# Altium footprint library GRID.PcbLib: 54 footprints (part 3 of 4)
Each footprint in its own frame and in the unit in brackets; x right, y up, seen from the top. Pads: shape width x height; smd on the part's side, far side on the other; paste and mask are expansions set on the pad; w line width, h text height; cw(c..) or ccw(c..) is an arc to the next point about the centre after c.
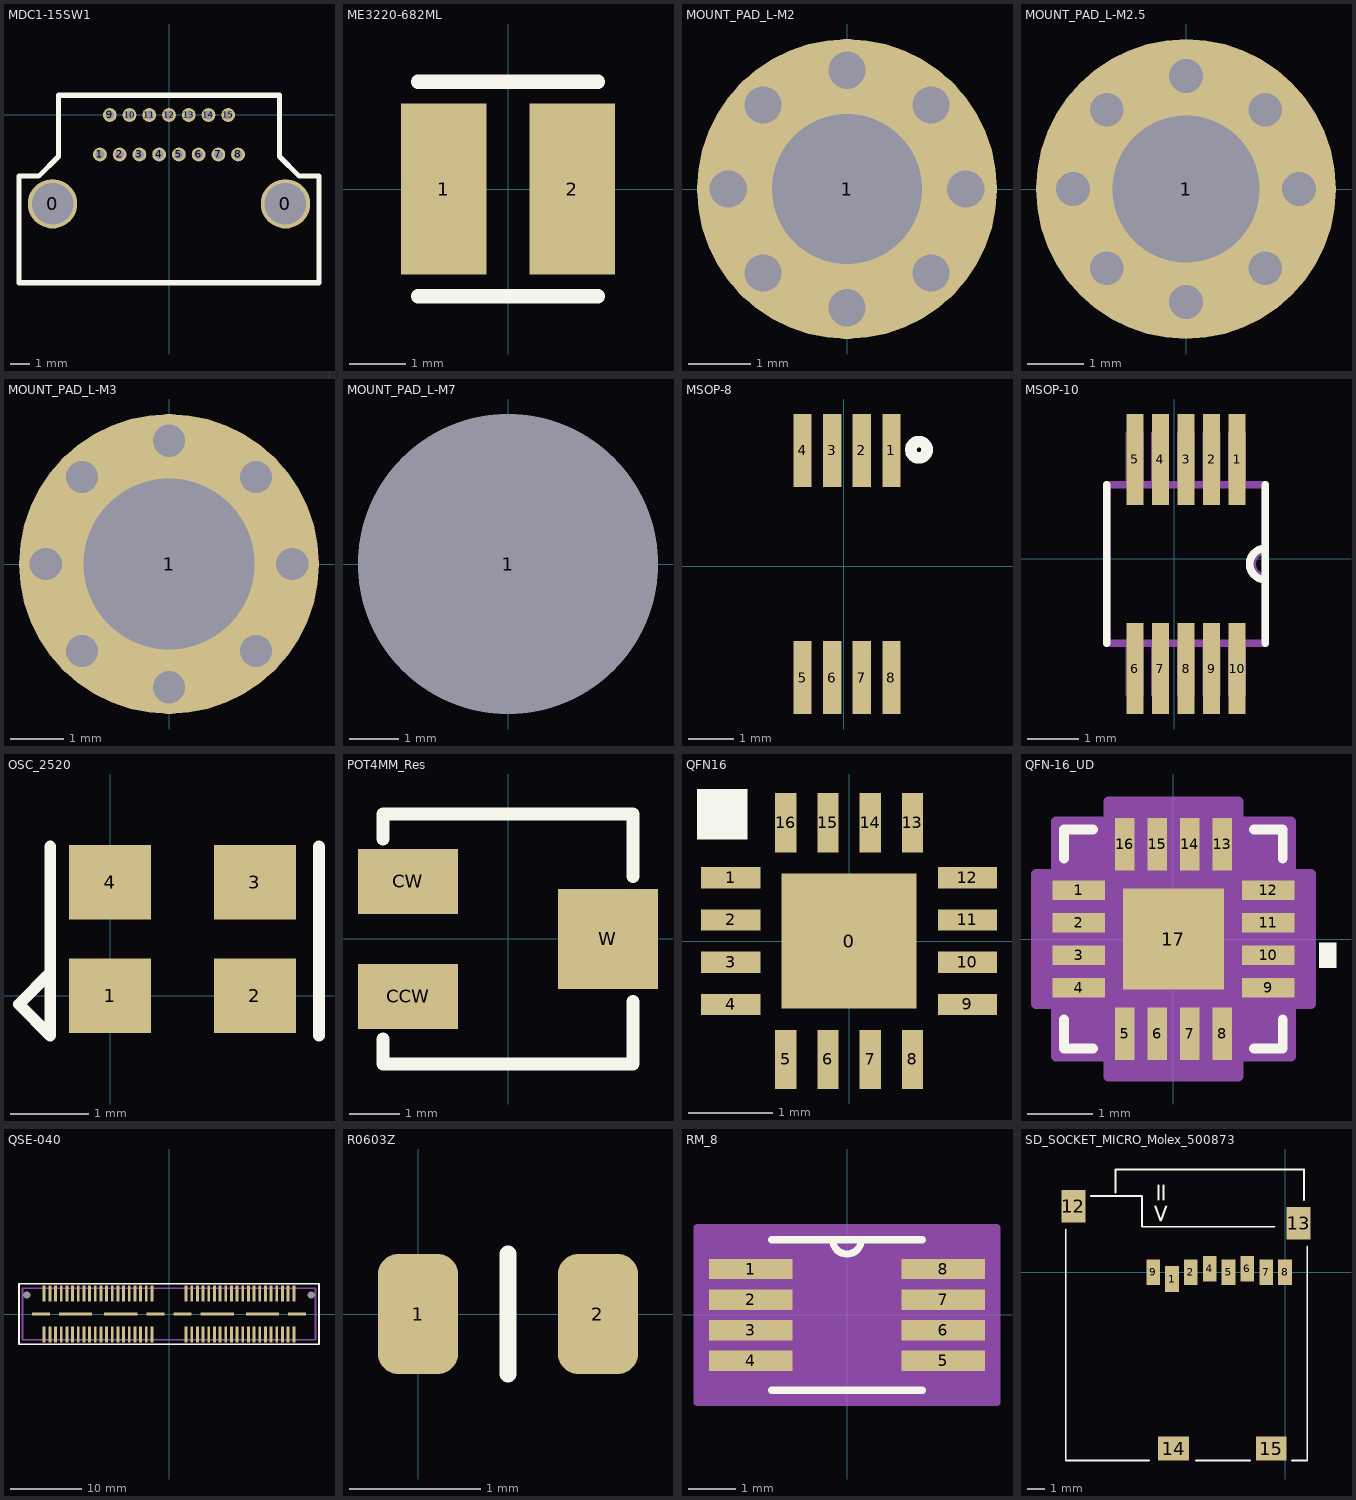
[diagram p2: the footprints below, top view; thin cyan lines are the x and y axes]

## MDC1-15SW1 [mm]
pads (17):
  round 2.5 hole 2.1: 0(-5.9,-4.5) 0(5.9,-4.5)
  round 0.7 hole 0.45: 1(-3.5,-2) 2(-2.5,-2) 3(-1.5,-2) 4(-0.5,-2) 5(0.5,-2) 6(1.5,-2) 7(2.501,-2) 8(3.5,-2) 9(-3,0) 10(-2,0) 11(-1,0) 12(0,0) 13(1,0) 14(2,0) 15(3,0)
Top Overlay:
  lines w0.254: -7.6,-8.5 -7.6,-4.5 -7.6,-3.1 -6.6,-3.1 -5.6,-2.1 -5.6,1 5.6,1 5.6,-2.1 6.6,-3.1 7.6,-3.1 7.6,-4.5 7.6,-8.5 -7.6,-8.5
3D body "MDC1-15SW1.STEP": height 3.8, standoff -2.6, extent -7.58,-8.497 7.62,1.003

## ME3220-682ML [mil] "ME3220-682ML"
pads (2):
  rect 60x120 smd: 1(-45,0) 2(45,0)
Top Overlay:
  lines w10: -63,-75 63,-75 ; -63,75 63,75

## MOUNT_PAD_L-M2 [mm]
pads (1):
  round 4.8 hole 2.4: 1(0,0)
via 1.9,0 diameter 1 hole 0.6
via 1.344,1.344 diameter 1 hole 0.6
via -1.344,1.344 diameter 1 hole 0.6
via -1.9,0 diameter 1 hole 0.6
via -1.344,-1.344 diameter 1 hole 0.6
via 0,-1.9 diameter 1 hole 0.6
via 1.344,-1.344 diameter 1 hole 0.6
via 0,1.9 diameter 1 hole 0.6

## MOUNT_PAD_L-M2.5 [mm]
pads (1):
  round 5.3 hole 2.6: 1(0,0)
via -1.4,1.4 diameter 1 hole 0.6
via 0,2 diameter 1 hole 0.6
via 1.4,1.4 diameter 1 hole 0.6
via 2,0 diameter 1 hole 0.6
via 1.4,-1.4 diameter 1 hole 0.6
via 0,-2 diameter 1 hole 0.6
via -1.4,-1.4 diameter 1 hole 0.6
via -2,0 diameter 1 hole 0.6

## MOUNT_PAD_L-M3 [mm]
pads (1):
  round 5.6 hole 3.2: 1(0,0)
via 1.626,-1.626 diameter 1 hole 0.6
via 0,-2.3 diameter 1 hole 0.6
via -1.626,-1.626 diameter 1 hole 0.6
via -2.3,0 diameter 1 hole 0.6
via -1.626,1.626 diameter 1 hole 0.6
via 0,2.3 diameter 1 hole 0.6
via 1.626,1.626 diameter 1 hole 0.6
via 2.3,0 diameter 1 hole 0.6

## MOUNT_PAD_L-M7 [mm]
pads (1):
  round 6.1 hole 6.1: 1(0,0)

## MSOP-8 [mm]
height 9.6
pads (8):
  rect 0.4x1.6 smd: 1(1.046,2.54) 2(0.396,2.54) 3(-0.254,2.54) 4(-0.904,2.54) 5(-0.904,-2.448) 6(-0.254,-2.448) 7(0.396,-2.448) 8(1.046,-2.448)
Top Overlay:
  circle w0.254: c1.651,2.554 r0.18

## MSOP-10 [mil]
pads (10):
  rect 13x70 smd: 1(48.37,76.5) 2(28.68,76.5) 3(9,76.5) 4(-10.69,76.5) 5(-30.37,76.5) 6(-30.37,-84.5) 7(-10.69,-84.5) 8(9,-84.5) 9(28.68,-84.5) 10(48.37,-84.5)
Top Overlay:
  lines w6: -52,-65 -52,57 ; 70,-65 70,57 ; 70,-16 cw(c70,-4) 70,8
Mechanical 1:
  lines w0: 70,-16 cw(c70,-4) 70,8 ; -52,-65 70,-65 70,57 -52,57 -52,-65 ; -36.87,-105.5 -23.87,-105.5 -23.87,-65 -36.87,-65 -36.87,-105.5 ; -36.87,57 -36.87,97.5 -23.87,97.5 -23.87,57 -36.87,57 ; -17.19,-105.5 -4.19,-105.5 -4.19,-65 -17.19,-65 -17.19,-105.5 ; -17.19,57 -17.19,97.5 -4.19,97.5 -4.19,57 -17.19,57 ; 2.5,-105.5 15.5,-105.5 15.5,-65 2.5,-65 2.5,-105.5 ; 2.5,57 2.5,97.5 15.5,97.5 15.5,57 2.5,57 ; 22.18,-105.5 35.18,-105.5 35.18,-65 22.18,-65 22.18,-105.5 ; 22.18,57 22.18,97.5 35.18,97.5 35.18,57 22.18,57 ; 41.87,-105.5 54.87,-105.5 54.87,-65 41.87,-65 41.87,-105.5 ; 41.87,57 41.87,97.5 54.87,97.5 54.87,57 41.87,57
  lines w6: 70,-14.17 cw(c70,-4) 70,6.17 ; -52,-65 70,-65 70,57 -52,57 -52,-65
3D body "User Library-msop-10.step": height 45.28, standoff 0, extent -49.76,-104.99 68.35,87.93

## OSC_2520 [mm]
pads (4):
  rect 1.05x0.95 smd: 1(0,0) 2(1.85,0) 3(1.85,1.45) 4(0,1.45)
Top Overlay:
  lines w0.15: -0.762,0.292 -1.162,-0.108 -0.762,-0.508 -0.762,1.905 ; 2.667,-0.508 2.667,1.905
3D body "User Library-NX2520SA.STEP": height 0.65, standoff 0, extent -0.351,-0.301 2.151,1.701

## POT4MM_Res [mm] "Square Trimming Potentiometer"
height 5.72
pads (3):
  rect 2x1.3 smd: CCW(-2,-1.15) CW(-2,1.15)
  rect 2x2 smd: W(2,0)
Top Overlay:
  lines w0.254: -2.5,-2 -2.5,-2.5 2.5,-2.5 2.5,-1.25 ; -2.5,2 -2.5,2.5 2.5,2.5 2.5,1.25
3D body "User Library-Pot 3214.step": height 5.1, standoff -0.3, extent -1.97,-2.413 1.97,2.387

## QFN16 [mm]
pads (17):
  rect 1.6x1.6 smd: 0(0,0)
  rect 0.7x0.25 smd: 1(-1.4,0.75) 2(-1.4,0.25) 3(-1.4,-0.25) 4(-1.4,-0.75) 9(1.4,-0.75) 10(1.4,-0.25) 11(1.4,0.25) 12(1.4,0.75)
  rect 0.25x0.7 smd: 5(-0.75,-1.4) 6(-0.25,-1.4) 7(0.25,-1.4) 8(0.75,-1.4) 13(0.75,1.4) 14(0.25,1.4) 15(-0.25,1.4) 16(-0.75,1.4)
Top Overlay:
  rectangle: -1.8,1.2 -1.2,1.8
3D body "User Library-QFN-16.STEP": height 0.9, standoff 0, extent -1.502,-1.501 1.5,1.501

## QFN-16_UD [mm]
pads (17):
  rect 0.805x0.3 smd: 1(-1.452,0.75) 2(-1.452,0.25) 3(-1.452,-0.25) 4(-1.452,-0.75) 9(1.452,-0.75) 10(1.452,-0.25) 11(1.452,0.25) 12(1.452,0.75)
  rect 0.3x0.805 smd: 5(-0.75,-1.452) 6(-0.25,-1.452) 7(0.25,-1.452) 8(0.75,-1.452) 13(0.75,1.452) 14(0.25,1.452) 15(-0.25,1.452) 16(-0.75,1.452)
  rect 1.55x1.55 smd paste-0.762: 17(0,0)
Top Overlay:
  region: 2.24,-0.059 2.494,-0.059 2.494,-0.44 2.24,-0.44
  lines w0.152: -1.677,-1.233 -1.677,-1.677 -1.233,-1.677 ; -1.677,1.233 -1.677,1.677 -1.233,1.677 ; 1.233,-1.677 1.677,-1.677 1.677,-1.233 ; 1.233,1.677 1.677,1.677 1.677,1.233
Top Paste:
  region: 0.775,0.775 -0.775,0.775 -0.775,-0.775 0.775,-0.775
Mechanical 13:
  lines w0.025: -1.55,0.28 -0.28,1.55 ; -1.55,-1.55 1.55,-1.55 1.55,1.55 -1.55,1.55 -1.55,-1.55 ; -1.55,-0.9 -1.55,-0.6 -1.55,-0.9 ; -1.55,-0.4 -1.55,-0.1 -1.55,-0.4 ; -1.55,0.1 -1.55,0.4 -1.55,0.1 ; -1.55,0.6 -1.55,0.9 -1.55,0.6 ; -0.9,-1.55 -0.6,-1.55 -0.9,-1.55 ; -0.9,1.55 -0.6,1.55 -0.9,1.55 ; -0.4,-1.55 -0.1,-1.55 -0.4,-1.55 ; -0.4,1.55 -0.1,1.55 -0.4,1.55 ; 0.1,-1.55 0.4,-1.55 0.1,-1.55 ; 0.1,1.55 0.4,1.55 0.1,1.55 ; 0.6,-1.55 0.9,-1.55 0.6,-1.55 ; 0.6,1.55 0.9,1.55 0.6,1.55 ; 1.55,-0.9 1.55,-0.6 1.55,-0.9 ; 1.55,-0.4 1.55,-0.1 1.55,-0.4 ; 1.55,0.1 1.55,0.4 1.55,0.1 ; 1.55,0.6 1.55,0.9 1.55,0.6
Mechanical 15:
  region: -1,-1.804 -1.804,-1.804 -1.804,-1 -2.109,-1 -2.109,1 -1.804,1 -1.804,1.804 -1,1.804 -1,2.109 1,2.109 1,1.804 1.804,1.804 1.804,1 2.109,1 2.109,-1 1.804,-1 1.804,-1.804 1,-1.804 1,-2.109 -1,-2.109
  lines w0.152: -2.109,-1 -1.804,-1 -1.804,-1.804 -1,-1.804 -1,-2.109 1,-2.109 1,-1.804 1.804,-1.804 1.804,-1 2.109,-1 2.109,1 1.804,1 1.804,1.804 1,1.804 1,2.109 -1,2.109 -1,1.804 -1.804,1.804 -1.804,1 -2.109,1 -2.109,-1
3D body: height 0.25, standoff 0, extent 0,0 0.254,0.254

## QSE-040 [mil]
pads (90):
  rect 16x89.5 smd mask+2: 1(-693,-112.8) 2(-693,112.8) 3(-661.5,-112.8) 4(-661.5,112.8) 5(-630,-112.8) 6(-630,112.8) 7(-598.5,-112.8) 8(-598.5,112.8) 9(-567,-112.8) 10(-567,112.8) 11(-535.5,-112.8) 12(-535.5,112.8) 13(-504,-112.8) 14(-504,112.8) 15(-472.5,-112.8) 16(-472.5,112.8) 17(-441,-112.8) 18(-441,112.8) 19(-409.5,-112.8) 20(-409.5,112.8) 21(-378,-112.8) 22(-378,112.8) 23(-346.5,-112.8) 24(-346.5,112.8) 25(-315,-112.8) 26(-315,112.8) 27(-283.5,-112.8) 28(-283.5,112.8) 29(-252,-112.8) 30(-252,112.8) 31(-220.5,-112.8) 32(-220.5,112.8) 33(-189,-112.8) 34(-189,112.8) 35(-157.5,-112.8) 36(-157.5,112.8) 37(-126,-112.8) 38(-126,112.8) 39(-94.5,-112.8) 40(-94.5,112.8) 41(94.5,-112.8) 42(94.5,112.8) 43(126,-112.8) 44(126,112.8) 45(157.5,-112.8) 46(157.5,112.8) 47(189,-112.8) 48(189,112.8) 49(220.5,-112.8) 50(220.5,112.8) 51(252,-112.8) 52(252,112.8) 53(283.5,-112.8) 54(283.5,112.8) 55(315,-112.8) 56(315,112.8) 57(346.5,-112.8) 58(346.5,112.8) 59(378,-112.8) 60(378,112.8) 61(409.5,-112.8) 62(409.5,112.8) 63(441,-112.8) 64(441,112.8) 65(472.5,-112.8) 66(472.5,112.8) 67(504,-112.8) 68(504,112.8) 69(535.5,-112.8) 70(535.5,112.8) 71(567,-112.8) 72(567,112.8) 73(598.5,-112.8) 74(598.5,112.8) 75(630,-112.8) 76(630,112.8) 77(661.5,-112.8) 78(661.5,112.8) 79(693,-112.8) 80(693,112.8)
  rect 100x17 smd mask+2: G1(-711.25,0) G4(-76.25,0) G5(76.25,0) G8(711.25,0)
  rect 185x17 smd mask+2: G2(-518.75,0) G3(-268.75,0) G6(268.75,0) G7(518.75,0)
  round 0 hole 40 unplated: MH1(-790,105) MH2(790,105)
Top Overlay:
  lines w10: -832.75,-167.55 -832.75,167.55 832.75,167.55 832.75,-167.55 -832.75,-167.55
Mechanical 1:
  lines w10: -812.75,-142.5 -812.75,142.5 812.75,142.5 812.75,-142.5 -812.75,-142.5
  text "J1" at -16.25,-70 h30
3D body "QSE-040-01-F-D-A.stp": height 120, standoff -38, extent -812.5,-147.5 812.5,147.5

## R0603Z [mil]
pads (2):
  rrect50% 24x36 smd: 1(0,0) 2(54,0)
Top Overlay:
  lines w5: 27,-18 27,18
3D body "RESC1508X63N EIA 0603.step": height 24.8, standoff 0, extent -2.52,-15.74 56.53,15.75

## RM_8 [mil]
pads (8):
  rect 70x17 smd mask+4: 1(-80.5,38.39) 2(-80.5,12.8) 3(-80.5,-12.8) 4(-80.5,-38.39) 5(80.5,-38.39) 6(80.5,-12.8) 7(80.5,12.8) 8(80.5,38.39)
Top Overlay:
  lines w6: -63,-63 63,-63 ; -63,63 63,63 ; -12,63 ccw(c0,63) 12,63
Mechanical 13:
  lines w0: -12,63 ccw(c0,63) 12,63
Mechanical 15:
  region: 125.5,-73 -125.5,-73 -125.5,73 125.5,73
  lines w6: -125.5,-73 125.5,-73 125.5,73 -125.5,73 -125.5,-73
3D body "RM_8.stp": height 43.1, standoff 0, extent -101.5,-63 101.5,63

## SD_SOCKET_MICRO_Molex_500873 [mm] "Molex Micro SD card socket with"
height 2.54
pads (12):
  rect 0.8x1.5 smd: 1(-6.6,-0.4) 2(-5.5,0) 4(-4.4,0.2) 5(-3.3,0) 6(-2.2,0.2) 7(-1.1,0) 8(0,0) 9(-7.7,0)
  rect 1.4x1.9 smd: 12(-12.36,3.85) 13(0.79,2.85)
  rect 1.8x1.4 smd: 14(-6.51,-10.3) 15(-0.81,-10.3)
Top Overlay:
  lines w0.102: -12.8,2.5 -12.8,-11 -7.95,-11 ; -11.35,4.45 -8.358,4.45 -8.358,2.646 -0.6,2.646 ; -9.9,4.65 -9.9,6 1.1,6 1.1,4.2 ; -5.2,-11 -2.05,-11 ; 0.4,-11 1.3,-11 1.3,1.5
  text "=>" at -7.7,5.25 h1.07
3D body "SW3dPS-Micro_SD.STEP": height 1.95, standoff 0.97, extent -9.9,-9.05 1.1,5.95
3D body "5008730816.stp": height 2, standoff 0.1, extent -12.8,-10.851 1.2,4.35